# Altium footprint library MyComponents_v2.5.PcbLib: 403 footprints (part 23 of 26)
Each footprint in its own frame and in the unit in brackets; x right, y up, seen from the top. Pads: shape width x height; smd on the part's side, far side on the other; paste and mask are expansions set on the pad; w line width, h text height; cw(c..) or ccw(c..) is an arc to the next point about the centre after c.
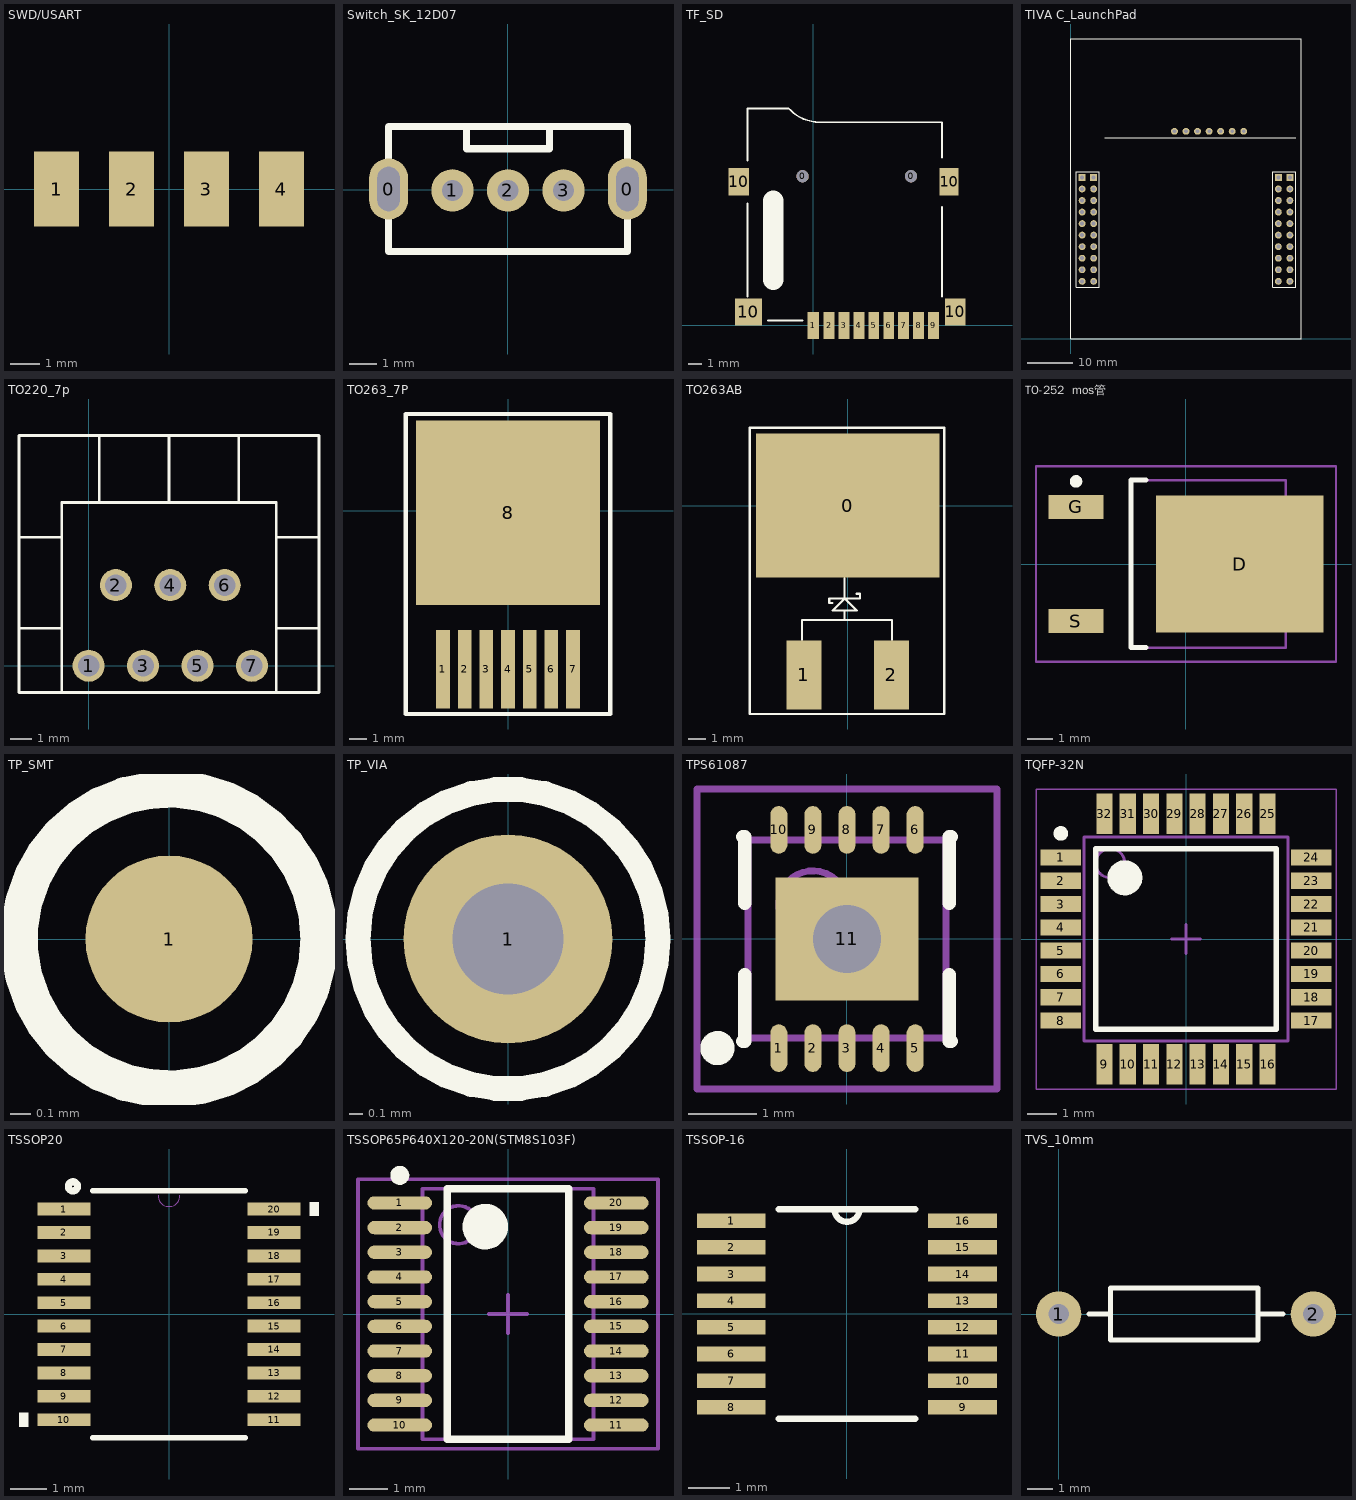
[diagram p22: the footprints below, top view; thin cyan lines are the x and y axes]

## SWD/USART [mil] "BLDC_SMD-SWD/USART"
pads (4):
  rect 60x100 smd: 1(-150,0) 2(-50,0) 3(50,0) 4(150,0)

## Switch_SK_12D07 [mm]
pads (5):
  oval 1.4x2.2 hole 0.8 slot 1.6 at 90 deg: 0(-4.3,0.025) 0(4.3,0.025)
  round 1.524 hole 0.762: 1(-2,-0.025) 2(0,-0.025) 3(2,-0.025)
Top Overlay:
  lines w0.254: -1.5,2.275 -1.5,1.475 1.5,1.475 1.5,2.275 ; -4.3,-2.225 4.3,-2.225 4.3,2.275 -4.3,2.275 -4.3,-2.225

## TF_SD [mm] "SD卡"
pads (15):
  round 0.9 hole 0.9 unplated: 0(-0.8,11) 0(7.2,11)
  rect 0.85x2 smd: 1(0,0)
  rect 0.8x2 smd: 2(1.15,0) 3(2.25,0) 4(3.35,0) 5(4.45,0) 6(5.55,0) 7(6.65,0) 8(7.75,0) 9(8.85,0)
  rect 1.5x2 smd: 10(-5.5,10.6) 10(10.45,1)
  rect 2x2 smd: 10(-4.8,1)
  rect 1.4x2 smd: 10(10,10.6)
Top Overlay:
  lines w0.127: -4.865,12.143 -4.865,15 ; -4.865,14.683 -4.865,16 -1.816,16 -1.714,15.898 ccw(c0.454,18.066) 0.454,15 1.74,15 9.486,15 9.486,12.397 ; -4.862,2.138 -4.862,8.996 ; 9.489,2.138 9.489,8.742
  lines w0.15: -3.338,0.36 -0.798,0.36
  lines w1.5: -2.959,3.38 -2.959,9.222
3D body "User Library-micro-sd-card.STEP": height 2.2, standoff -0.5, extent -5.796,-0.274 10.304,16.926

## TIVA C_LaunchPad [mil]
pads (47):
  rect 60x60 hole 35: 1(100,1400) 2(200,1400) 21(1800,1400) 22(1900,1400)
  round 60 hole 35: 3(100,1300) 4(200,1300) 5(100,1200) 6(200,1200) 7(100,1100) 8(200,1100) 9(100,1000) 10(200,1000) 11(100,900) 12(200,900) 13(100,800) 14(200,800) 15(100,700) 16(200,700) 17(100,600) 18(200,600) 19(100,500) 20(200,500) 23(1800,1300) 24(1900,1300) 25(1800,1200) 26(1900,1200) 27(1800,1100) 28(1900,1100) 29(1800,1000) 30(1900,1000) 31(1800,900) 32(1900,900) 33(1800,800) 34(1900,800) 35(1800,700) 36(1900,700) 37(1800,600) 38(1900,600) 39(1800,500) 40(1900,500)
  round 59.06 hole 31.5: 41(900,1800) 42(1000,1800) 43(1100,1800) 44(1200,1800) 45(1300,1800) 46(1400,1800) 47(1500,1800)
Top Overlay:
  lines w7.87: 0,0 0,2600 2000,2600 2000,0 0,0 ; 50,450 250,450 250,1450 50,1450 50,450 ; 1750,450 1950,450 1950,1450 1750,1450 1750,450
  lines w10: 294,1745 1950,1745

## TO220_7p [mm]
pads (7):
  round 1.5 hole 1: 1(0,0) 2(1.27,3.762) 3(2.54,0) 4(3.81,3.762) 5(5.08,0) 6(6.35,3.762) 7(7.62,0)
Top Overlay:
  lines w0.127: -3.25,1.75 -1.25,1.75 ; -3.25,6 -1.25,6 ; 0.5,7.62 0.5,10.75 ; 3.75,7.62 3.75,10.75 ; 7,7.62 7,10.75 ; 8.75,1.75 10.75,1.75 ; 8.75,6 10.75,6 ; -1.25,-1.25 -3.25,-1.25 -3.25,10.75 10.75,10.75 10.75,-1.25 8.75,-1.25 ; -1.25,-1.25 8.75,-1.25 ; -1.25,-1.25 -1.25,7.62 8.75,7.62 8.75,-1.25

## TO263_7P [mm]
pads (8):
  rect 0.8x4.6 smd: 1(-3.835,-9.296) 2(-2.565,-9.296) 3(-1.295,-9.296) 4(-0.025,-9.296) 5(1.245,-9.296) 6(2.515,-9.296) 7(3.785,-9.296)
  rect 10.8x10.8 smd: 8(-0.025,-0.127)
Top Overlay:
  lines w0.254: -6.02,-11.913 -6.02,5.664 5.969,5.664 5.969,-11.913 -6.02,-11.913

## TO263AB [mm]
pads (3):
  rect 10.66x8.38 smd: 0(0,0)
  rect 2.032x4 smd: 1(-2.55,-9.85) 2(2.55,-9.85)
Top Overlay:
  lines w0.127: -2.65,-7.825 -2.65,-6.65 -0.175,-6.65 ; -0.9,-5.675 -1.075,-5.675 -1.075,-5.4 0.725,-5.4 0.725,-5.125 0.525,-5.125 ; -0.175,-6.125 -0.175,-6.65 ; -0.175,-4.225 -0.175,-5.4 ; 2.575,-7.825 2.575,-6.65 -0.175,-6.65 ; -0.175,-5.4 -0.875,-6.1 0.525,-6.1 -0.175,-5.4 ; -0.175,-5.4 -0.175,-5.4 ; -0.175,-5.4 -0.175,-5.4 ; -5.7,-12.125 -5.7,4.525 5.625,4.525 5.625,-12.125 -5.7,-12.125

## TO-252  mos管 [mm] "D-PAK, 4-Leads, Body 6.1x6.5mm, Pitch 2.28mm, Lead Span 9.8mm, IPC Low Density"
height 2.38
pads (3):
  rect 6.7x5.5 smd: D(2.15,0)
  rect 2.2x0.95 smd: G(-4.4,2.28) S(-4.4,-2.28)
Top Overlay:
  circle w0.25: c-4.4,3.305 r0.125
  lines w0.2: -1.6,-3.35 -2.2,-3.35 -2.2,3.35 -1.6,3.35
Mechanical 13:
  lines w0.1: -2.2,-3.35 -2.2,3.35 4,3.35 4,-3.35 -2.2,-3.35
Mechanical 15:
  lines w0.1: -0.5,0 0.5,0 ; 0,-0.5 0,0.5 ; -6,-3.9 -6,3.9 6,3.9 6,-3.9 -6,-3.9
3D body "User Library-DPAK-1.STEP": height 2.39, standoff -0.02, extent -4.9,-3.27 5.038,3.27

## TP_SMT [mm]
pads (1):
  round 0.8 smd: 1(0,0)
Top Overlay:
  circle w0.178: c0,0 r0.718

## TP_VIA [mm]
pads (1):
  round 1.5 hole 0.8: 1(0,0)
Top Overlay:
  circle w0.178: c0,0 r1.078

## TPS61087 [mm]
height 1
pads (11):
  oval 0.25x0.7 smd: 1(-1,-1.6) 2(-0.5,-1.6) 3(0,-1.6) 4(0.5,-1.6) 5(1,-1.6) 6(1,1.6) 7(0.5,1.6) 8(0,1.6) 9(-0.5,1.6) 10(-1,1.6)
  rect 2.1x1.8 smd: 11(0,0)
via 0,0 diameter 1.5 hole 1
Top Overlay:
  circle w0.25: c-1.9,-1.6 r0.125
  lines w0.2: -1.525,-1.5 -1.5,-1.5 -1.5,-0.525 ; -1.525,1.5 -1.5,1.5 -1.5,0.525 ; 1.5,-0.525 1.5,-1.5 1.525,-1.5 ; 1.5,0.525 1.5,1.5 1.525,1.5
Mechanical 13:
  circle w0.1: c-0.5,0.5 r0.5
  lines w0.1: -1.45,-1.45 -1.45,1.45 1.45,1.45 1.45,-1.45 -1.45,-1.45
Mechanical 15:
  lines w0.1: -0.5,0 0.5,0 ; 0,-0.5 0,0.5 ; -2.2,-2.2 -2.2,2.2 2.2,2.2 2.2,-2.2 -2.2,-2.2
3D body: height 1, standoff 0.05, extent -1.45,-1.45 1.45,1.45

## TQFP-32N [mm] "TQFP, 32-Leads, Body 7.00x7.00mm, Pitch 0.80mm, IPC Medium Density"
height 1.2
pads (32):
  rect 1.4x0.55 smd: 1(-4.3,2.8) 2(-4.3,2) 3(-4.3,1.2) 4(-4.3,0.4) 5(-4.3,-0.4) 6(-4.3,-1.2) 7(-4.3,-2) 8(-4.3,-2.8) 17(4.3,-2.8) 18(4.3,-2) 19(4.3,-1.2) 20(4.3,-0.4) 21(4.3,0.4) 22(4.3,1.2) 23(4.3,2) 24(4.3,2.8)
  rect 0.55x1.4 smd: 9(-2.8,-4.3) 10(-2,-4.3) 11(-1.2,-4.3) 12(-0.4,-4.3) 13(0.4,-4.3) 14(1.2,-4.3) 15(2,-4.3) 16(2.8,-4.3) 25(2.8,4.3) 26(2,4.3) 27(1.2,4.3) 28(0.4,4.3) 29(-0.4,4.3) 30(-1.2,4.3) 31(-2,4.3) 32(-2.8,4.3)
Top Overlay:
  circle w0.25: c-4.3,3.625 r0.125
  circle w0.6: c-2.1,2.1 r0.3
  lines w0.2: -3.1,-3.1 -3.1,3.1 3.1,3.1 3.1,-3.1 -3.1,-3.1
Mechanical 13:
  circle w0.1: c-2.6,2.6 r0.5
  lines w0.1: -3.5,-3.5 -3.5,3.5 3.5,3.5 3.5,-3.5 -3.5,-3.5
Mechanical 15:
  lines w0.05: -5.15,-5.15 -5.15,5.15 5.15,5.15 5.15,-5.15 -5.15,-5.15
  lines w0.1: -0.5,0 0.5,0 ; 0,-0.5 0,0.5
3D body: height 1.2, standoff 0.25, extent -3.5,-3.5 3.5,3.5

## TSSOP20 [mil]
pads (20):
  rect 58x14 smd: 1(-115,115.16) 2(-115,89.57) 3(-115,63.98) 4(-115,38.39) 5(-115,12.8) 6(-115,-12.8) 7(-115,-38.39) 8(-115,-63.98) 9(-115,-89.57) 10(-115,-115.16) 11(115,-115.16) 12(115,-89.57) 13(115,-63.98) 14(115,-38.39) 15(115,-12.8) 16(115,12.8) 17(115,38.39) 18(115,63.98) 19(115,89.57) 20(115,115.16)
Top Overlay:
  circle w7.87: c-105,140 r5
  region: -154,-107.66 -164,-107.66 -164,-122.66 -154,-122.66
  region: 154,122.66 164,122.66 164,107.66 154,107.66
  lines w6: -83.42,-135 83.42,-135 ; -83.42,135 83.42,135
Mechanical 13:
  lines w0: -12,130 ccw(c0,130) 12,130
3D body "TSSOP20.stp": height 44.49, standoff 0, extent -125.98,-127.95 125.99,127.96

## TSSOP65P640X120-20N(STM8S103F) [mm] "TSOP, 20-Leads, Body 6.6x4.5mm (max), Pitch 0.65mm, IPC Medium Density"
height 1.2
pads (20):
  oval 1.7x0.35 smd: 1(-2.85,2.925) 2(-2.85,2.275) 3(-2.85,1.625) 4(-2.85,0.975) 5(-2.85,0.325) 6(-2.85,-0.325) 7(-2.85,-0.975) 8(-2.85,-1.625) 9(-2.85,-2.275) 10(-2.85,-2.925) 11(2.85,-2.925) 12(2.85,-2.275) 13(2.85,-1.625) 14(2.85,-0.975) 15(2.85,-0.325) 16(2.85,0.325) 17(2.85,0.975) 18(2.85,1.625) 19(2.85,2.275) 20(2.85,2.925)
Top Overlay:
  circle w0.6: c-0.6,2.3 r0.3
  circle w0.25: c-2.85,3.65 r0.125
  lines w0.2: -1.6,-3.3 1.6,-3.3 1.6,3.3 -1.6,3.3 -1.6,-3.3
Mechanical 13:
  circle w0.1: c-1.3,2.35 r0.5
  lines w0.1: -2.25,-3.3 2.25,-3.3 2.25,3.3 -2.25,3.3 -2.25,-3.3
Mechanical 15:
  lines w0.1: -0.5,0 0.5,0 ; 0,-0.5 0,0.5 ; -3.95,-3.55 3.95,-3.55 3.95,3.55 -3.95,3.55 -3.95,-3.55
3D body: height 1.13, standoff 0, extent -3.2,-3.25 3.2,3.25

## TSSOP-16 [mil]
pads (16):
  rect 66x14 smd: 1(-111,89.57) 2(-111,63.98) 3(-111,38.39) 4(-111,12.8) 5(-111,-12.8) 6(-111,-38.39) 7(-111,-63.98) 8(-111,-89.57) 9(111,-89.57) 10(111,-63.98) 11(111,-38.39) 12(111,-12.8) 13(111,12.8) 14(111,38.39) 15(111,63.98) 16(111,89.57)
Top Overlay:
  lines w6: -65.5,-100.5 65.5,-100.5 ; -65.5,100.5 65.5,100.5 ; -12,100.5 ccw(c0,100.5) 12,100.5
Mechanical 13:
  lines w0: -12,100.5 ccw(c0,100.5) 12,100.5
3D body "TSSOP-16.stp": height 44.49, standoff 0, extent -124.98,-98.42 126.99,98.44

## TVS_10mm [mil]
pads (2):
  round 70 hole 31.5: 1(0,0) 2(393.7,0)
Top Overlay:
  lines w7.87: 47.24,0 80,0 ; 312,0 346.46,0 ; 80,0 80,-40 308,-40 308,40 80,40 80,0